# Altium footprint library Inductors THD.PcbLib: 43 footprints (part 4 of 4)
Each footprint in its own frame and in the unit in brackets; x right, y up, seen from the top. Pads: shape width x height; smd on the part's side, far side on the other; paste and mask are expansions set on the pad; w line width, h text height; cw(c..) or ccw(c..) is an arc to the next point about the centre after c.
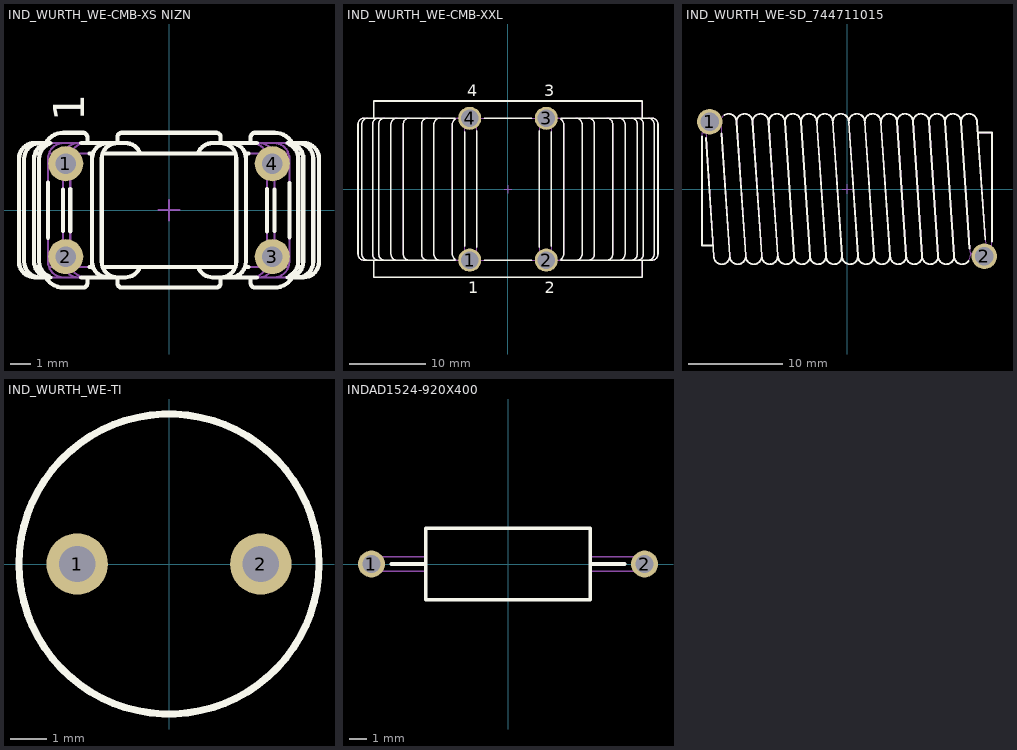
[diagram p3: the footprints below, top view; thin cyan lines are the x and y axes]

## IND_WURTH_WE-CMB-XS NIZN [mm] "WURTH Common Mode Choke WE-CMB XS Series"
height 18
pads (4):
  round 1.7 hole 1: 1(-5,2.25) 2(-5,-2.25) 3(5,-2.25) 4(5,2.25)
Top Overlay:
  lines w0.2: -6.487,-2.75 -6.244,-2.75 ; -6.487,2.75 -6.244,2.75 ; -6.26,-3.25 cw(c-6.26,-2.5) -7.01,-2.5 -7.01,2.5 cw(c-6.26,2.5) -6.26,3.25 ; -5.854,-1.338 -5.854,1.338 ; -5.817,-3.196 cw(c-5.537,-2.5) -6.287,-2.5 -6.287,2.5 cw(c-5.537,2.5) -5.817,3.196 ; -5.78,-3.25 cw(c-5.78,-2.5) -6.53,-2.5 -6.53,2.5 cw(c-5.78,2.5) -5.78,3.25 ; -5.75,-3.25 -6.51,-3.25 ; -5.75,3.25 -6.51,3.25 ; -5.134,-1.007 -5.134,1.007 ; -4.78,-1.02 -4.78,1.02 ; -4.25,-3.25 -2.113,-3.25 ccw(c-2.113,-2.5) -1.406,-2.75 ; -4.25,3.25 -2.109,3.25 cw(c-2.109,2.5) -1.402,2.75 ; -3.95,3.25 -3.95,3.525 ccw(c-4.175,3.525) -4.175,3.75 -5.1,3.75 ccw(c-5.1,2.75) -5.966,3.25 -6.51,3.25 ; -3.854,-2.75 -3.679,-2.75 ; -3.854,2.75 -3.679,2.75 ; -3.212,-2.75 3.217,-2.75 ; -3.212,2.75 3.217,2.75 ; -2.972,-3.25 cw(c-2.972,-2.5) -3.722,-2.5 -3.722,2.5 cw(c-2.972,2.5) -2.972,3.25 ; -2.505,-3.25 cw(c-2.505,-2.5) -3.255,-2.5 -3.255,2.5 cw(c-2.505,2.5) -2.505,3.25 ; -2.5,3.25 -2.5,3.525 cw(c-2.275,3.525) -2.275,3.75 2.275,3.75 cw(c2.275,3.525) 2.5,3.525 2.5,3.25 3.95,3.25 3.95,3.525 cw(c4.175,3.525) 4.175,3.75 5.1,3.75 cw(c5.1,2.75) 5.966,3.25 6.51,3.25 ; 1.406,-2.75 ccw(c2.113,-2.5) 2.113,-3.25 4.25,-3.25 ; 1.406,2.75 cw(c2.113,2.5) 2.113,3.25 4.25,3.25 ; 2.505,-3.25 ccw(c2.505,-2.5) 3.255,-2.5 3.255,2.5 ; 2.509,3.25 cw(c2.509,2.5) 3.259,2.499 ; 2.972,-3.25 ccw(c2.972,-2.5) 3.722,-2.5 3.722,2.5 ; 2.976,3.25 cw(c2.976,2.5) 3.726,2.499 ; 3.683,-2.75 3.854,-2.75 ; 3.683,2.75 3.854,2.75 ; 4.75,-1.025 4.75,1.025 ; 5.103,-1.004 5.103,1.004 ; 5.749,-3.25 ccw(c5.749,-2.5) 6.499,-2.5 6.499,2.5 ; 5.75,-3.25 6.51,-3.25 ; 5.75,3.25 6.51,3.25 ; 5.754,3.25 cw(c5.754,2.5) 6.504,2.499 ; 5.824,-1.31 5.824,1.31 ; 5.843,3.173 cw(c5.512,2.5) 6.262,2.499 ; 5.849,-3.168 ccw(c5.507,-2.5) 6.257,-2.5 6.257,2.5 ; 6.219,-2.75 6.461,-2.75 ; 6.219,2.75 6.461,2.75 ; 6.23,-3.25 ccw(c6.23,-2.5) 6.98,-2.5 6.98,2.5 ; 6.234,3.25 cw(c6.234,2.5) 6.984,2.499 ; -6.51,-3.25 cw(c-6.51,-2.5) -7.26,-2.5 -7.26,2.5 cw(c-6.51,2.5) -6.51,3.25 ; -6.51,-3.25 -5.966,-3.25 ccw(c-5.1,-2.75) -5.1,-3.75 -4.175,-3.75 ccw(c-4.175,-3.525) -3.95,-3.525 -3.95,-3.25 -2.5,-3.25 -2.5,-3.525 ccw(c-2.275,-3.525) -2.305,-3.748 2.275,-3.75 ccw(c2.275,-3.525) 2.5,-3.525 2.5,-3.25 3.95,-3.25 3.95,-3.525 ccw(c4.175,-3.525) 4.175,-3.75 5.1,-3.75 ccw(c5.1,-2.75) 5.966,-3.25 6.51,-3.25 ; 6.51,-3.25 ccw(c6.51,-2.5) 7.26,-2.5 7.26,2.5 ccw(c6.51,2.5) 6.51,3.25
  text "1" at -4.1,4.3 h1.5
Mechanical 8:
  lines w0.1: -5.5,-2.25 -5,-2.25 ; -5.5,2.25 -5,2.25 ; -5,-2.75 -5,-2.25 ; -5,-1.75 -5,-2.25 ; -5,1.75 -5,2.25 ; -5,2.75 -5,2.25 ; -4.5,-2.25 -5,-2.25 ; -4.5,2.25 -5,2.25 ; -0.5,0 0,0 ; 0,-0.5 0,0 ; 0,0.5 0,0 ; 0.5,0 0,0 ; 4.5,-2.25 5,-2.25 ; 4.5,2.25 5,2.25 ; 5,-2.75 5,-2.25 ; 5,-1.75 5,-2.25 ; 5,1.75 5,2.25 ; 5,2.75 5,2.25 ; 5.5,-2.25 5,-2.25 ; 5.5,2.25 5,2.25
Mechanical 14:
  lines w0.1: -6.487,-2.75 -6.244,-2.75 ; -6.487,2.75 -6.244,2.75 ; -6.26,-3.25 cw(c-6.26,-2.5) -7.01,-2.5 -7.01,2.5 cw(c-6.26,2.5) -6.26,3.25 ; -5.811,-2.75 -5.091,-2.75 ; -5.811,2.75 -5.091,2.75 ; -5.78,-3.25 cw(c-5.78,-2.5) -6.53,-2.5 -6.53,2.5 cw(c-5.78,2.5) -5.78,3.25 ; -5.537,-3.25 cw(c-5.537,-2.5) -6.287,-2.5 -6.287,2.5 cw(c-5.537,2.5) -5.537,3.25 ; -5.104,-3.25 cw(c-5.104,-2.5) -5.854,-2.5 -5.854,2.5 cw(c-5.104,2.5) -5.104,3.25 ; -4.737,-2.75 -3.679,-2.75 ; -4.737,2.75 -3.679,2.75 ; -4.384,-3.25 cw(c-4.384,-2.5) -5.134,-2.5 -5.134,2.5 cw(c-4.384,2.5) -4.384,3.25 ; -4.03,-3.25 cw(c-4.03,-2.5) -4.78,-2.5 -4.78,2.5 cw(c-4.03,2.5) -4.03,3.25 ; -3.95,3.25 -3.95,3.525 ccw(c-4.175,3.525) -4.175,3.75 -5.1,3.75 ccw(c-5.1,2.75) -5.966,3.25 -6.51,3.25 ; -3.212,-2.75 3.217,-2.75 ; -3.212,2.75 3.217,2.75 ; -2.972,-3.25 cw(c-2.972,-2.5) -3.722,-2.5 -3.722,2.5 cw(c-2.972,2.5) -2.972,3.25 ; -2.505,-3.25 cw(c-2.505,-2.5) -3.255,-2.5 -3.255,2.5 cw(c-2.505,2.5) -2.505,3.25 ; -2.5,3.25 -2.5,3.525 cw(c-2.275,3.525) -2.275,3.75 2.275,3.75 cw(c2.275,3.525) 2.5,3.525 2.5,3.25 3.95,3.25 3.95,3.525 cw(c4.175,3.525) 4.175,3.75 5.1,3.75 cw(c5.1,2.75) 5.966,3.25 6.51,3.25 ; -1.406,-2.75 cw(c-2.113,-2.5) -2.113,-3.25 -6.51,-3.25 ; -1.402,2.75 ccw(c-2.109,2.5) -2.109,3.25 -6.51,3.25 ; 1.406,-2.75 ccw(c2.113,-2.5) 2.113,-3.25 6.51,-3.25 ; 1.406,2.75 cw(c2.113,2.5) 2.113,3.25 6.51,3.25 ; 2.505,-3.25 ccw(c2.505,-2.5) 3.255,-2.5 3.255,2.5 ; 2.509,3.25 cw(c2.509,2.5) 3.259,2.499 ; 2.972,-3.25 ccw(c2.972,-2.5) 3.722,-2.5 3.722,2.5 ; 2.976,3.25 cw(c2.976,2.5) 3.726,2.499 ; 3.683,-2.75 4.711,-2.75 ; 3.683,2.75 4.711,2.75 ; 4,-3.25 ccw(c4,-2.5) 4.75,-2.5 4.75,2.5 ; 4.004,3.25 cw(c4.004,2.5) 4.754,2.499 ; 4.353,-3.25 ccw(c4.353,-2.5) 5.103,-2.5 5.103,2.5 ; 4.358,3.25 cw(c4.358,2.5) 5.108,2.499 ; 5.065,-2.75 5.786,-2.75 ; 5.065,2.75 5.786,2.75 ; 5.074,-3.25 ccw(c5.074,-2.5) 5.824,-2.5 5.824,2.5 ; 5.079,3.25 cw(c5.079,2.5) 5.829,2.499 ; 5.507,-3.25 ccw(c5.507,-2.5) 6.257,-2.5 6.257,2.5 ; 5.512,3.25 cw(c5.512,2.5) 6.262,2.499 ; 5.749,-3.25 ccw(c5.749,-2.5) 6.499,-2.5 6.499,2.5 ; 5.754,3.25 cw(c5.754,2.5) 6.504,2.499 ; 6.219,-2.75 6.461,-2.75 ; 6.219,2.75 6.461,2.75 ; 6.23,-3.25 ccw(c6.23,-2.5) 6.98,-2.5 6.98,2.5 ; 6.234,3.25 cw(c6.234,2.5) 6.984,2.499 ; -6.51,-3.25 cw(c-6.51,-2.5) -7.26,-2.5 -7.26,2.5 cw(c-6.51,2.5) -6.51,3.25 ; -6.51,-3.25 -5.966,-3.25 ccw(c-5.1,-2.75) -5.1,-3.75 -4.175,-3.75 ccw(c-4.175,-3.525) -3.95,-3.525 -3.95,-3.25 -2.5,-3.25 -2.5,-3.525 ccw(c-2.275,-3.525) -2.305,-3.748 2.275,-3.75 ccw(c2.275,-3.525) 2.5,-3.525 2.5,-3.25 3.95,-3.25 3.95,-3.525 ccw(c4.175,-3.525) 4.175,-3.75 5.1,-3.75 ccw(c5.1,-2.75) 5.966,-3.25 6.51,-3.25 ; 6.51,-3.25 ccw(c6.51,-2.5) 7.26,-2.5 7.26,2.5 ccw(c6.51,2.5) 6.51,3.25
  text "1" at -4.1,4.3 h1.5
3D body "IND_WURTH_WE-CMB-XS NIZN.stp": height 17.5, standoff -2.15, extent -7.26,-3.75 7.26,3.75

## IND_WURTH_WE-CMB-XXL [mm] "WURTH Common Mode Choke WE-CMB XXL Series"
height 43
pads (4):
  round 3 hole 2.3: 1(-5,-9.25) 2(5,-9.25) 3(5,9.25) 4(-5,9.25)
Top Overlay:
  lines w0.2: -19.062,8.47 cw(c-18.262,8.47) -18.262,9.27 ; -19.061,8.509 -19.062,-8.47 ccw(c-18.262,-8.47) -18.262,-9.27 ; -17.662,8.47 cw(c-16.862,8.47) -16.862,9.27 ; -17.661,8.509 -17.662,-8.47 ccw(c-16.862,-8.47) -16.862,-9.27 ; -17.5,-9.27 -17.5,-11.5 17.5,-11.5 17.5,-9.27 ; -17.5,9.27 -17.5,11.5 17.5,11.5 17.5,9.27 ; -16.862,8.47 cw(c-16.062,8.47) -16.062,9.27 ; -16.861,8.509 -16.862,-8.47 ccw(c-16.062,-8.47) -16.062,-9.27 ; -15.262,8.47 cw(c-14.462,8.47) -14.462,9.27 ; -15.261,8.509 -15.262,-8.47 ccw(c-14.462,-8.47) -14.462,-9.27 ; -9.662,8.47 cw(c-8.862,8.47) -8.862,9.27 ; -9.661,8.509 -9.662,-8.47 ccw(c-8.862,-8.47) -8.862,-9.27 ; -6.9,-9.27 -18.762,-9.27 ; -6.9,9.27 -18.762,9.27 ; -5.662,-7.469 -5.661,7.469 ; -4.062,-7.598 -4.061,7.598 ; -3.1,-9.27 3.1,-9.27 ; -3.1,9.27 3.1,9.27 ; 4.062,-7.598 4.061,7.598 ; 5.662,-7.469 5.661,7.469 ; 6.9,-9.27 18.762,-9.27 ; 6.9,9.27 18.762,9.27 ; 8.862,-9.27 ccw(c8.862,-8.47) 9.662,-8.47 9.661,8.509 ; 8.862,9.27 cw(c8.862,8.47) 9.662,8.47 ; 14.462,-9.27 ccw(c14.462,-8.47) 15.262,-8.47 15.261,8.509 ; 14.462,9.27 cw(c14.462,8.47) 15.262,8.47 ; 16.062,-9.27 ccw(c16.062,-8.47) 16.862,-8.47 16.861,8.509 ; 16.062,9.27 cw(c16.062,8.47) 16.862,8.47 ; 16.862,-9.27 ccw(c16.862,-8.47) 17.662,-8.47 17.661,8.509 ; 16.862,9.27 cw(c16.862,8.47) 17.662,8.47 ; 18.262,-9.27 ccw(c18.262,-8.47) 19.062,-8.47 19.061,8.509 ; 18.262,9.27 cw(c18.262,8.47) 19.062,8.47 ; -19.562,-8.47 ccw(c-18.762,-8.47) -18.762,-9.27 ; -19.562,-8.47 ccw(c-18.762,-8.47) -18.762,-9.27 ; -19.562,-8.47 -19.561,8.509 -19.562,-8.47 ; -18.762,9.27 ccw(c-18.762,8.47) -19.562,8.47 cw(c-18.762,8.47) -18.762,9.27 ; -13.662,-8.47 ccw(c-12.862,-8.47) -12.862,-9.27 cw(c-12.862,-8.47) -13.662,-8.47 ; -13.662,-8.47 -13.661,8.509 -13.662,-8.47 ; -11.262,-8.47 ccw(c-10.462,-8.47) -10.462,-9.27 ; -11.262,-8.47 ccw(c-10.462,-8.47) -10.462,-9.27 ; -11.262,-8.47 ccw(c-10.462,-8.47) -10.462,-9.27 ; -11.262,-8.47 -11.261,8.509 ; -11.262,-8.47 -11.261,8.509 ; -11.262,-8.47 -11.261,8.509 ; -11.262,8.47 cw(c-10.462,8.47) -10.462,9.27 ; -11.262,8.47 cw(c-10.462,8.47) -10.462,9.27 ; -11.262,8.47 cw(c-10.462,8.47) -10.462,9.27 ; -7.262,-8.47 ccw(c-6.462,-8.47) -6.897,-9.142 ; -7.262,-8.47 ccw(c-6.462,-8.47) -6.897,-9.142 ; -7.262,-8.47 ccw(c-6.462,-8.47) -6.897,-9.142 ; -7.262,-8.47 -7.261,8.509 ; -7.262,-8.47 -7.261,8.509 ; -7.262,-8.47 -7.261,8.509 ; -7.262,8.47 cw(c-6.462,8.47) -6.897,9.142 ; -7.262,8.47 cw(c-6.462,8.47) -6.897,9.142 ; -7.262,8.47 cw(c-6.462,8.47) -6.897,9.142 ; 6.897,-9.142 ccw(c6.462,-8.47) 7.262,-8.47 ; 6.897,-9.142 ccw(c6.462,-8.47) 7.262,-8.47 ; 6.897,-9.142 ccw(c6.462,-8.47) 7.262,-8.47 ; 6.897,9.142 cw(c6.462,8.47) 7.262,8.47 ; 6.897,9.142 cw(c6.462,8.47) 7.262,8.47 ; 6.897,9.142 cw(c6.462,8.47) 7.262,8.47 ; 7.261,8.509 7.262,-8.47 ; 7.261,8.509 7.262,-8.47 ; 7.261,8.509 7.262,-8.47 ; 10.462,-9.27 ccw(c10.462,-8.47) 11.262,-8.47 ; 10.462,-9.27 ccw(c10.462,-8.47) 11.262,-8.47 ; 10.462,-9.27 ccw(c10.462,-8.47) 11.262,-8.47 ; 10.462,9.27 cw(c10.462,8.47) 11.262,8.47 ; 10.462,9.27 cw(c10.462,8.47) 11.262,8.47 ; 10.462,9.27 cw(c10.462,8.47) 11.262,8.47 ; 11.261,8.509 11.262,-8.47 ; 11.261,8.509 11.262,-8.47 ; 11.261,8.509 11.262,-8.47 ; 13.662,-8.47 cw(c12.862,-8.47) 12.862,-9.27 ccw(c12.862,-8.47) 13.662,-8.47 ; 13.662,-8.47 13.661,8.509 13.662,-8.47 ; 18.762,-9.27 ccw(c18.762,-8.47) 19.562,-8.47 ; 18.762,-9.27 ccw(c18.762,-8.47) 19.562,-8.47 ; 18.762,9.27 cw(c18.762,8.47) 19.562,8.47 ccw(c18.762,8.47) 18.762,9.27 ; 19.562,-8.47 19.561,8.509 19.562,-8.47 ; -13.662,8.47 cw(c-12.862,8.47) -12.862,9.27 ccw(c-12.862,8.47) -13.662,8.47 ; 12.862,9.27 cw(c12.862,8.47) 13.662,8.47 ccw(c12.862,8.47) 12.862,9.27
  text "4" at -5.3,12.15 h1.5
  text "3" at 4.7,12.15 h1.5
  text "2" at 4.8,-13.6 h1.5
  text "1" at -5.2,-13.6 h1.5
Mechanical 8:
  lines w0.1: -5.5,-9.25 -5,-9.25 ; -5.5,9.25 -5,9.25 ; -5,-9.75 -5,-9.25 ; -5,-8.75 -5,-9.25 ; -5,8.75 -5,9.25 ; -5,9.75 -5,9.25 ; -4.5,-9.25 -5,-9.25 ; -4.5,9.25 -5,9.25 ; -0.5,0 0,0 ; 0,-0.5 0,0 ; 0,0.5 0,0 ; 0.5,0 0,0 ; 4.5,-9.25 5,-9.25 ; 4.5,9.25 5,9.25 ; 5,-9.75 5,-9.25 ; 5,-8.75 5,-9.25 ; 5,8.75 5,9.25 ; 5,9.75 5,9.25 ; 5.5,-9.25 5,-9.25 ; 5.5,9.25 5,9.25
Mechanical 14:
  lines w0.1: -19.062,8.47 cw(c-18.262,8.47) -18.262,9.27 ; -19.061,8.509 -19.062,-8.47 ccw(c-18.262,-8.47) -18.262,-9.27 ; -17.662,8.47 cw(c-16.862,8.47) -16.862,9.27 ; -17.661,8.509 -17.662,-8.47 ccw(c-16.862,-8.47) -16.862,-9.27 ; -17.5,-9.27 -17.5,-11.5 17.5,-11.5 17.5,-9.27 ; -17.5,9.27 -17.5,11.5 17.5,11.5 17.5,9.27 ; -16.862,8.47 cw(c-16.062,8.47) -16.062,9.27 ; -16.861,8.509 -16.862,-8.47 ccw(c-16.062,-8.47) -16.062,-9.27 ; -15.262,8.47 cw(c-14.462,8.47) -14.462,9.27 ; -15.261,8.509 -15.262,-8.47 ccw(c-14.462,-8.47) -14.462,-9.27 ; -9.662,8.47 cw(c-8.862,8.47) -8.862,9.27 ; -9.661,8.509 -9.662,-8.47 ccw(c-8.862,-8.47) -8.862,-9.27 ; -5.662,8.47 cw(c-4.862,8.47) -4.862,9.27 cw(c-4.861,8.47) -4.061,8.47 ; -5.661,8.509 -5.662,-8.47 ccw(c-4.862,-8.47) -4.862,-9.27 ccw(c-4.861,-8.47) -4.061,-8.47 -4.061,8.509 ; 4.061,-8.47 ccw(c4.861,-8.47) 4.861,-9.27 ccw(c4.862,-8.47) 5.662,-8.47 5.661,8.509 ; 4.061,8.47 cw(c4.861,8.47) 4.861,9.27 cw(c4.862,8.47) 5.662,8.47 ; 4.061,8.509 4.062,-8.47 ; 8.862,-9.27 ccw(c8.862,-8.47) 9.662,-8.47 9.661,8.509 ; 8.862,9.27 cw(c8.862,8.47) 9.662,8.47 ; 14.462,-9.27 ccw(c14.462,-8.47) 15.262,-8.47 15.261,8.509 ; 14.462,9.27 cw(c14.462,8.47) 15.262,8.47 ; 16.062,-9.27 ccw(c16.062,-8.47) 16.862,-8.47 16.861,8.509 ; 16.062,9.27 cw(c16.062,8.47) 16.862,8.47 ; 16.862,-9.27 ccw(c16.862,-8.47) 17.662,-8.47 17.661,8.509 ; 16.862,9.27 cw(c16.862,8.47) 17.662,8.47 ; 18.262,-9.27 ccw(c18.262,-8.47) 19.062,-8.47 19.061,8.509 ; 18.262,9.27 cw(c18.262,8.47) 19.062,8.47 ; -19.562,-8.47 ccw(c-18.762,-8.47) -18.762,-9.27 ; -19.562,-8.47 ccw(c-18.762,-8.47) -18.762,-9.27 ; -19.562,-8.47 -19.561,8.509 -19.562,-8.47 ; -18.762,-9.27 18.762,-9.27 ; -18.762,9.27 ccw(c-18.762,8.47) -19.562,8.47 cw(c-18.762,8.47) -18.762,9.27 ; -18.762,9.27 18.762,9.27 ; -13.662,-8.47 ccw(c-12.862,-8.47) -12.862,-9.27 cw(c-12.862,-8.47) -13.662,-8.47 ; -13.662,-8.47 -13.661,8.509 -13.662,-8.47 ; -11.262,-8.47 ccw(c-10.462,-8.47) -10.462,-9.27 ; -11.262,-8.47 ccw(c-10.462,-8.47) -10.462,-9.27 ; -11.262,-8.47 ccw(c-10.462,-8.47) -10.462,-9.27 ; -11.262,-8.47 -11.261,8.509 ; -11.262,-8.47 -11.261,8.509 ; -11.262,-8.47 -11.261,8.509 ; -11.262,8.47 cw(c-10.462,8.47) -10.462,9.27 ; -11.262,8.47 cw(c-10.462,8.47) -10.462,9.27 ; -11.262,8.47 cw(c-10.462,8.47) -10.462,9.27 ; -7.262,-8.47 ccw(c-6.462,-8.47) -6.462,-9.27 ; -7.262,-8.47 ccw(c-6.462,-8.47) -6.462,-9.27 ; -7.262,-8.47 ccw(c-6.462,-8.47) -6.462,-9.27 ; -7.262,-8.47 -7.261,8.509 ; -7.262,-8.47 -7.261,8.509 ; -7.262,-8.47 -7.261,8.509 ; -7.262,8.47 cw(c-6.462,8.47) -6.462,9.27 ; -7.262,8.47 cw(c-6.462,8.47) -6.462,9.27 ; -7.262,8.47 cw(c-6.462,8.47) -6.462,9.27 ; 6.462,-9.27 ccw(c6.462,-8.47) 7.262,-8.47 ; 6.462,-9.27 ccw(c6.462,-8.47) 7.262,-8.47 ; 6.462,-9.27 ccw(c6.462,-8.47) 7.262,-8.47 ; 6.462,9.27 cw(c6.462,8.47) 7.262,8.47 ; 6.462,9.27 cw(c6.462,8.47) 7.262,8.47 ; 6.462,9.27 cw(c6.462,8.47) 7.262,8.47 ; 7.261,8.509 7.262,-8.47 ; 7.261,8.509 7.262,-8.47 ; 7.261,8.509 7.262,-8.47 ; 10.462,-9.27 ccw(c10.462,-8.47) 11.262,-8.47 ; 10.462,-9.27 ccw(c10.462,-8.47) 11.262,-8.47 ; 10.462,-9.27 ccw(c10.462,-8.47) 11.262,-8.47 ; 10.462,9.27 cw(c10.462,8.47) 11.262,8.47 ; 10.462,9.27 cw(c10.462,8.47) 11.262,8.47 ; 10.462,9.27 cw(c10.462,8.47) 11.262,8.47 ; 11.261,8.509 11.262,-8.47 ; 11.261,8.509 11.262,-8.47 ; 11.261,8.509 11.262,-8.47 ; 13.662,-8.47 cw(c12.862,-8.47) 12.862,-9.27 ccw(c12.862,-8.47) 13.662,-8.47 ; 13.662,-8.47 13.661,8.509 13.662,-8.47 ; 18.762,-9.27 ccw(c18.762,-8.47) 19.562,-8.47 ; 18.762,-9.27 ccw(c18.762,-8.47) 19.562,-8.47 ; 18.762,9.27 cw(c18.762,8.47) 19.562,8.47 ccw(c18.762,8.47) 18.762,9.27 ; 19.562,-8.47 19.561,8.509 19.562,-8.47 ; -13.662,8.47 cw(c-12.862,8.47) -12.862,9.27 ccw(c-12.862,8.47) -13.662,8.47 ; 12.862,9.27 cw(c12.862,8.47) 13.662,8.47 ccw(c12.862,8.47) 12.862,9.27
  text "4" at -5.3,12.15 h1.5
  text "3" at 4.7,12.15 h1.5
  text "2" at 4.8,-13.6 h1.5
  text "1" at -5.2,-13.6 h1.5
3D body "IND_WURTH_WE-CMB-XXL.stp": height 39.4, standoff -5, extent -19.6,-11.5 19.6,11.5

## IND_WURTH_WE-SD_744711015 [mm] "WURTH Filter Choke WE-SD Series"
height 16
pads (2):
  round 2.7 hole 2: 1(-14.6,7.15) 2(14.6,-7.15)
Top Overlay:
  lines w0.2: -15.4,5.594 -15.4,-6 -14.241,-6 ; -14.978,5.441 -14.167,-7.148 ccw(c-13.317,-7.15) -12.469,-7.089 ; -13.357,5.918 -12.468,-7.095 ; -13.013,7.888 cw(c-12.591,7.15) -11.741,7.15 -10.768,-7.095 ; -12.467,-7.15 ccw(c-11.617,-7.15) -10.769,-7.089 ; -11.733,7.032 cw(c-10.891,7.15) -10.041,7.15 -9.068,-7.095 ; -10.767,-7.15 ccw(c-9.917,-7.15) -9.069,-7.089 ; -10.033,7.032 cw(c-9.191,7.15) -8.341,7.15 -7.368,-7.095 ; -9.067,-7.15 ccw(c-8.217,-7.15) -7.369,-7.089 ; -8.302,7.032 cw(c-7.46,7.151) -6.61,7.151 -5.638,-7.095 ; -7.336,-7.149 ccw(c-6.486,-7.149) -5.638,-7.088 ; -6.602,7.032 cw(c-5.76,7.151) -4.91,7.151 -3.938,-7.095 ; -5.636,-7.149 ccw(c-4.786,-7.149) -3.938,-7.088 ; -4.902,7.032 cw(c-4.06,7.151) -3.21,7.151 -2.238,-7.095 ; -3.936,-7.149 ccw(c-3.086,-7.149) -2.238,-7.088 ; -3.202,7.032 cw(c-2.36,7.151) -1.51,7.151 -0.538,-7.095 ; -2.236,-7.149 ccw(c-1.386,-7.149) -0.538,-7.088 ; -1.502,7.032 cw(c-0.66,7.151) 0.19,7.151 1.162,-7.095 ; -0.536,-7.149 ccw(c0.314,-7.149) 1.162,-7.088 ; 0.198,7.032 cw(c1.04,7.151) 1.89,7.151 2.862,-7.095 ; 1.164,-7.149 ccw(c2.014,-7.149) 2.862,-7.088 ; 1.898,7.032 cw(c2.74,7.151) 3.59,7.151 4.562,-7.095 ; 2.864,-7.149 ccw(c3.714,-7.149) 4.562,-7.088 ; 3.629,7.033 cw(c4.47,7.151) 5.32,7.151 6.293,-7.094 ; 4.595,-7.149 ccw(c5.445,-7.149) 6.292,-7.088 ; 5.329,7.033 cw(c6.17,7.151) 7.02,7.151 7.993,-7.094 ; 6.295,-7.149 ccw(c7.145,-7.149) 7.992,-7.088 ; 7.029,7.033 cw(c7.87,7.151) 8.72,7.151 9.693,-7.094 ; 7.995,-7.149 ccw(c8.845,-7.149) 9.692,-7.088 ; 8.729,7.033 cw(c9.57,7.151) 10.42,7.151 11.393,-7.094 ; 9.695,-7.149 ccw(c10.545,-7.149) 11.392,-7.088 ; 10.429,7.033 cw(c11.27,7.151) 12.12,7.151 13.042,-6.353 ; 11.395,-7.149 ccw(c12.245,-7.149) 12.925,-7.658 ; 12.129,7.033 cw(c12.97,7.151) 13.82,7.151 14.698,-5.403 ; 13.901,6 15.4,6 15.4,-5.594
Mechanical 8:
  lines w0.1: -15.1,7.15 -14.6,7.15 ; -14.6,6.65 -14.6,7.15 ; -14.6,7.65 -14.6,7.15 ; -14.1,7.15 -14.6,7.15 ; -0.5,0 0,0 ; 0,-0.5 0,0 ; 0,0.5 0,0 ; 0.5,0 0,0 ; 14.1,-7.15 14.6,-7.15 ; 14.6,-7.65 14.6,-7.15 ; 14.6,-6.65 14.6,-7.15 ; 15.1,-7.15 14.6,-7.15
Mechanical 14:
  lines w0.1: -15.014,6 -15.4,6 -15.4,-6 -14.241,-6 ; -13.393,6.454 -13.814,7.474 ccw(c-14.6,7.15) -15.337,6.727 -15.026,6.184 -14.167,-7.148 ccw(c-13.317,-7.15) -12.469,-7.089 ; -12.468,-7.095 -13.433,7.032 cw(c-12.591,7.15) -11.741,7.15 -10.768,-7.095 ; -12.467,-7.15 ccw(c-11.617,-7.15) -10.769,-7.089 ; -11.733,7.032 cw(c-10.891,7.15) -10.041,7.15 -9.068,-7.095 ; -10.767,-7.15 ccw(c-9.917,-7.15) -9.069,-7.089 ; -10.033,7.032 cw(c-9.191,7.15) -8.341,7.15 -7.368,-7.095 ; -9.067,-7.15 ccw(c-8.217,-7.15) -7.369,-7.089 ; -8.302,7.032 cw(c-7.46,7.151) -6.61,7.151 -5.638,-7.095 ; -7.336,-7.149 ccw(c-6.486,-7.149) -5.638,-7.088 ; -6.602,7.032 cw(c-5.76,7.151) -4.91,7.151 -3.938,-7.095 ; -5.636,-7.149 ccw(c-4.786,-7.149) -3.938,-7.088 ; -4.902,7.032 cw(c-4.06,7.151) -3.21,7.151 -2.238,-7.095 ; -3.936,-7.149 ccw(c-3.086,-7.149) -2.238,-7.088 ; -3.202,7.032 cw(c-2.36,7.151) -1.51,7.151 -0.538,-7.095 ; -2.236,-7.149 ccw(c-1.386,-7.149) -0.538,-7.088 ; -1.502,7.032 cw(c-0.66,7.151) 0.19,7.151 1.162,-7.095 ; -0.536,-7.149 ccw(c0.314,-7.149) 1.162,-7.088 ; 0.198,7.032 cw(c1.04,7.151) 1.89,7.151 2.862,-7.095 ; 1.164,-7.149 ccw(c2.014,-7.149) 2.862,-7.088 ; 1.898,7.032 cw(c2.74,7.151) 3.59,7.151 4.562,-7.095 ; 2.864,-7.149 ccw(c3.714,-7.149) 4.562,-7.088 ; 3.629,7.033 cw(c4.47,7.151) 5.32,7.151 6.293,-7.094 ; 4.595,-7.149 ccw(c5.445,-7.149) 6.292,-7.088 ; 5.329,7.033 cw(c6.17,7.151) 7.02,7.151 7.993,-7.094 ; 6.295,-7.149 ccw(c7.145,-7.149) 7.992,-7.088 ; 7.029,7.033 cw(c7.87,7.151) 8.72,7.151 9.693,-7.094 ; 7.995,-7.149 ccw(c8.845,-7.149) 9.692,-7.088 ; 8.729,7.033 cw(c9.57,7.151) 10.42,7.151 11.393,-7.094 ; 9.695,-7.149 ccw(c10.545,-7.149) 11.392,-7.088 ; 10.429,7.033 cw(c11.27,7.151) 12.12,7.151 13.092,-7.088 cw(c12.245,-7.149) 11.395,-7.149 ; 12.129,7.033 cw(c12.97,7.151) 13.82,7.151 14.739,-6 ; 13.063,-6.651 13.952,-7.7 ccw(c14.6,-7.15) 15.248,-6.6 14.739,-6 ; 13.901,6 15.4,6 15.4,-6 14.739,-6
3D body "IND_WURTH_WE-SD_744711015.stp": height 16, standoff -3, extent -15.449,-8 15.449,8

## IND_WURTH_WE-TI [mm] "Radial Leaded Wire Wound Inductor D=8.3mm WE-TI Series"
height 10
pads (2):
  round 1.7 hole 1: 1(-2.54,0) 2(2.54,0)
Top Overlay:
  circle w0.2: c0,0 r4.15
Mechanical 14:
  circle w0.1: c0,0 r4.15
3D body "INDRD_WURTH_WE-TI.stp": height 10, standoff -3.6, extent -4.65,-4.65 4.65,4.65

## INDAD1524-920X400 [mm] "Inductor, Axial Diameter, Pad spacing 15.24 mm - Body Lengh 9.2mm X Body Diameter 4mm"
height 4
pads (2):
  round 1.5 hole 1: 1(-7.62,0) 2(7.62,0)
Top Overlay:
  lines w0.2: -6.5,0 -4.6,0 ; 4.6,0 6.5,0 ; -4.6,-2 4.6,-2 4.6,2 -4.6,2 -4.6,-2
Mechanical 14:
  lines w0.1: -7.62,-0.4 -4.6,-0.4 -4.6,0.4 -7.62,0.4 -7.62,-0.4 ; -4.6,-2 4.6,-2 4.6,2 -4.6,2 -4.6,-2 ; 4.6,-0.4 4.6,0.4 7.62,0.4 7.62,-0.4 4.6,-0.4
3D body "INDAD1524-920X400.stp": height 4, standoff -3.6, extent -8.02,-2 8.02,2